# Altium footprint library ALL.PcbLib: 385 footprints (part 4 of 25)
Each footprint in its own frame and in the unit in brackets; x right, y up, seen from the top. Pads: shape width x height; smd on the part's side, far side on the other; paste and mask are expansions set on the pad; w line width, h text height; cw(c..) or ccw(c..) is an arc to the next point about the centre after c.
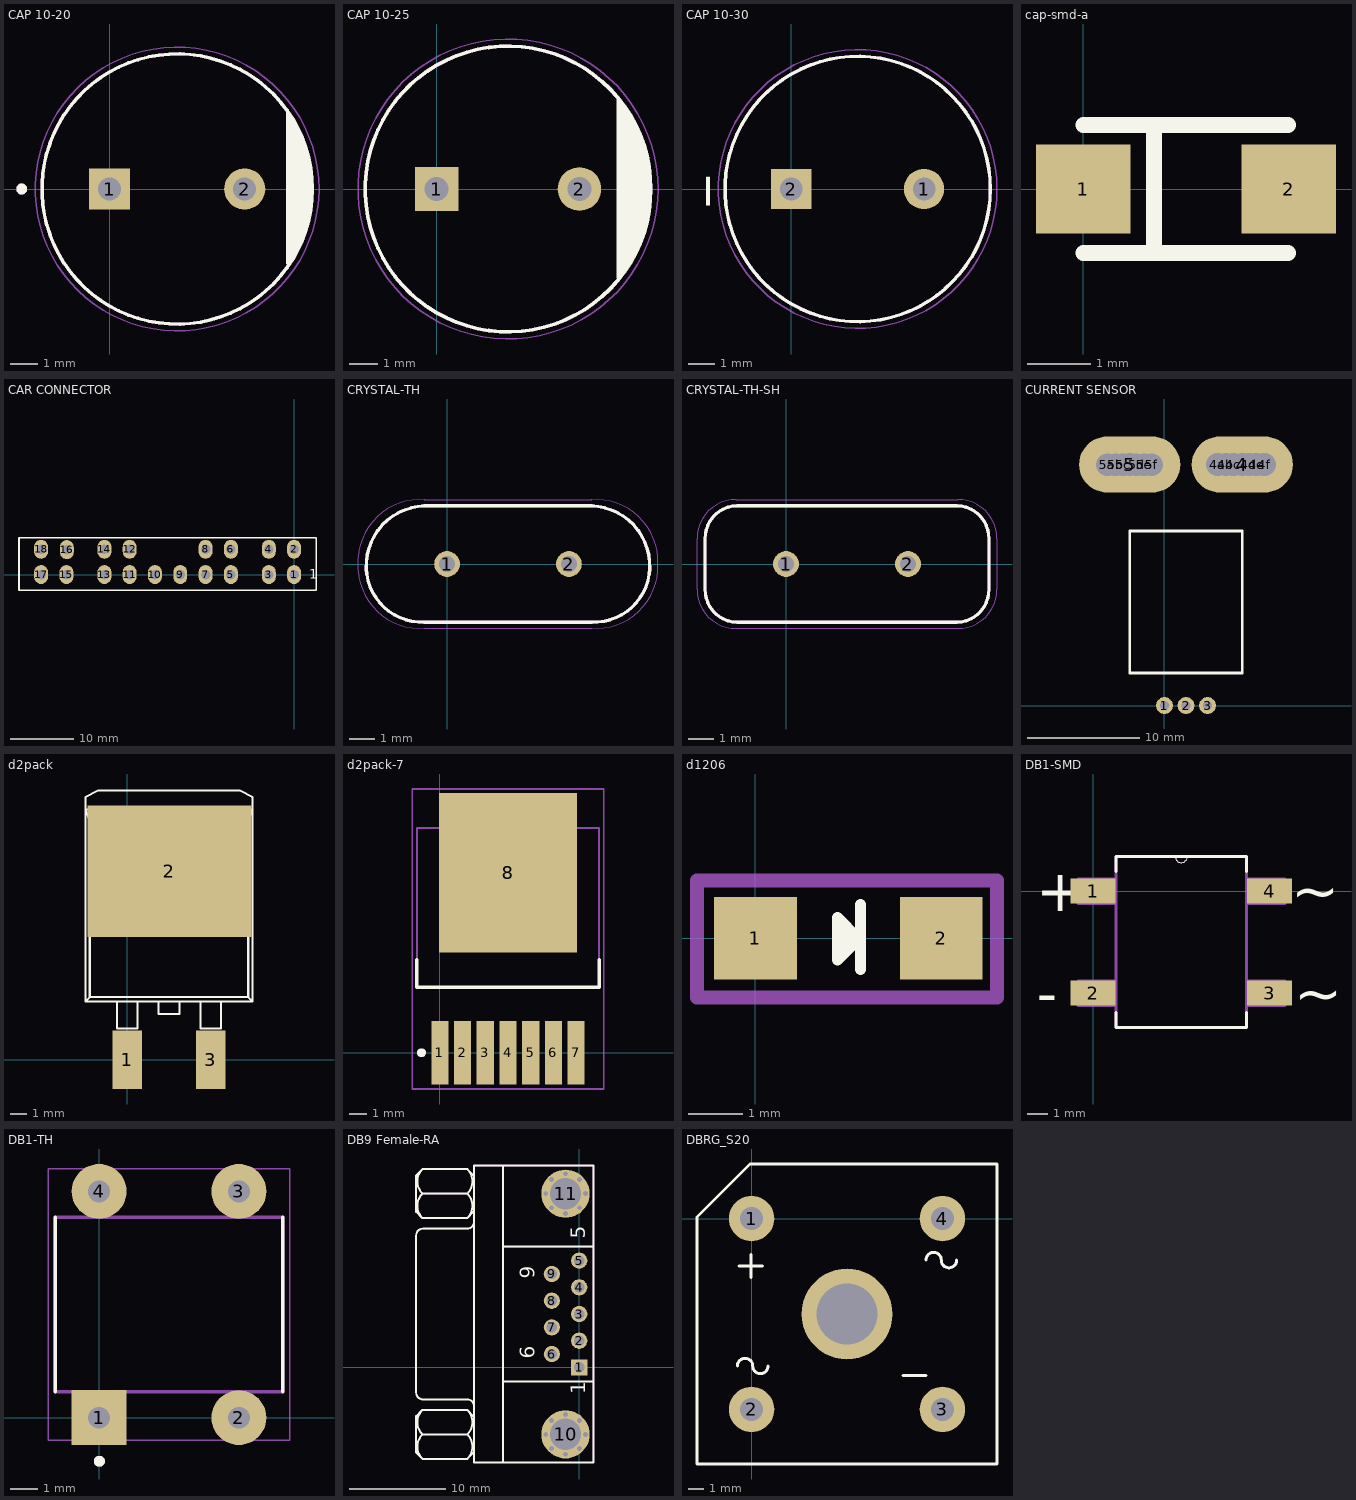
[diagram p3: the footprints below, top view; thin cyan lines are the x and y axes]

## CAP 10-20 [mil]
pads (2):
  rect 60x60 hole 33.46: 1(0,0)
  round 60 hole 33.46: 2(196.85,0)
Top Overlay:
  circle w7.87: c-127.95,0 r3.94
  circle w5: c98.43,0 r196.85
  lines w5.91: 260,-108 260,111 ; 264,-105 264,104 ; 267,-99 267,98 ; 271,-91 271,94 ; 271,-83 274,-80 274,81 ; 278,76 279,75 279,-76 ; 282,63 282,-63 283,-64 ; 286,-53 286,53 ; 289,-39 289,37 ; 292,-21 292,26
Mechanical 13:
  circle w7.87: c-127.95,0 r3.94
  circle w5: c98.43,0 r196.85
Mechanical 15:
  circle w1.97: c98.43,0 r206.69
3D body "step_temp.STEP": height 787.4, standoff -669.29, extent -98.43,-196.85 295.28,196.85

## CAP 10-25 [mil]
pads (2):
  rect 60x60 hole 33.46: 1(0,0)
  round 60 hole 33.46: 2(196.85,0)
Top Overlay:
  circle w5: c98.43,0 r196.85
  lines w5.91: 251,-122 251,123 ; 254,117 255,116 255,-115 ; 259,-110 259,109 ; 261,105 264,102 264,-105 ; 269,-96 269,97 ; 274,-88 274,87 ; 278,-78 278,76 ; 279,69 283,65 283,-65 ; 286,-51 287,-50 287,48 ; 287,35 290,32 290,-33
Mechanical 13:
  circle w5: c98.43,0 r196.85
Mechanical 15:
  circle w1.97: c98.43,0 r206.69
3D body "step_temp.STEP": height 984.25, standoff -669.29, extent -98.43,-196.82 295.28,196.82

## CAP 10-30 [mil]
pads (2):
  round 60 hole 33.46: 1(196.85,0)
  rect 60x60 hole 33.46: 2(0,0)
Top Overlay:
  circle w5: c98.43,0 r196.85
  text "_" at -139.99,-24 h60
Mechanical 13:
  circle w5: c98.43,0 r196.85
Mechanical 15:
  circle w1.97: c98.43,0 r206.69
3D body "step_temp.STEP": height 1181.1, standoff -669.29, extent -98.43,-196.7 295.27,196.68

## cap-smd-a [mm]
pads (2):
  rect 1.5x1.42 smd: 1(0,0) 2(3.26,0)
Top Overlay:
  lines w0.254: 0,-1.016 3.25,-1.016 ; 0,1.016 3.25,1.016 ; 1.122,-1.016 1.122,1.016
3D body "A Case SMT Capacitor.STEP": height 1.77, standoff 0.17, extent -0.007,-0.8 3.167,0.8

## cap-smd-b [mm]

## CAR CONNECTOR [mm]
pads (18):
  oval 2.2x3 hole 1.5: 1(0,0) 2(0,4) 3(-4,0) 4(-4,4) 5(-10,0) 6(-10,4) 7(-14,0) 8(-14,4) 9(-18,0) 10(-22,0) 11(-26,0) 12(-26,4) 13(-30,0) 14(-30,4) 15(-36,0) 16(-35.941,3.937) 17(-40,0) 18(-40,4)
Top Overlay:
  lines w0.254: -43.5,-2.5 3.5,-2.5 3.5,5.842 -43.5,5.842 -43.5,-2.5
  text "1" at 2.413,-0.635 h1.52

## CRYSTAL-TH [mm]
pads (2):
  round 1.03 hole 0.63: 1(0,0) 2(4.88,0)
Top Overlay:
  lines w0.127: -3.235,-0.169 cw(c-0.82,-0.085) -0.904,2.33 ; -3.235,-0.168 ccw(c-0.995,-0.09) -0.917,-2.33 ; -0.91,-2.33 5.79,-2.33 ; -0.91,2.33 5.79,2.33 ; 5.784,2.33 cw(c5.7,-0.085) 8.115,-0.169 ; 5.797,-2.33 ccw(c5.875,-0.09) 8.115,-0.168
Mechanical 13:
  lines w0.127: -3.235,-0.169 cw(c-0.82,-0.085) -0.904,2.33 ; -3.235,-0.168 ccw(c-0.995,-0.09) -0.917,-2.33 ; -0.91,-2.33 5.79,-2.33 ; -0.91,2.33 5.79,2.33 ; 5.784,2.33 cw(c5.7,-0.085) 8.115,-0.169 ; 5.797,-2.33 ccw(c5.875,-0.09) 8.115,-0.168
Mechanical 15:
  lines w0.05: -3.56,-0.25 -3.56,0.25 ; -3.559,-0.264 ccw(c-1.07,-0.09) -0.896,-2.579 ; -3.559,0.264 cw(c-1.07,0.09) -0.896,2.579 ; -0.91,-2.58 5.79,-2.58 ; -0.91,2.58 5.79,2.58 ; 5.776,-2.579 ccw(c5.95,-0.09) 8.439,-0.264 ; 5.776,2.579 cw(c5.95,0.09) 8.439,0.264 ; 8.44,-0.25 8.44,0.25
3D body "ECS-200-S-1 (1).STEP": height 13.46, standoff -12.7, extent -3.185,-2.5 8.165,2.5

## CRYSTAL-TH-SH [mm]
pads (2):
  round 1.03 hole 0.63: 1(0,0) 2(4.88,0)
Top Overlay:
  lines w0.127: -3.235,-1.012 ccw(c-1.94,-1.035) -1.963,-2.33 ; -3.235,-1.01 -3.235,1.01 ; -3.235,1.012 cw(c-1.94,1.035) -1.963,2.33 ; -1.965,-2.33 6.845,-2.33 ; -1.965,2.33 6.845,2.33 ; 6.843,-2.33 ccw(c6.82,-1.035) 8.115,-1.012 ; 6.843,2.33 cw(c6.82,1.035) 8.115,1.012 ; 8.115,-1.01 8.115,1.01
Mechanical 13:
  lines w0.127: -3.235,-1.012 ccw(c-1.94,-1.035) -1.963,-2.33 ; -3.235,-1.01 -3.235,1.01 ; -3.235,1.012 cw(c-1.94,1.035) -1.963,2.33 ; -1.965,-2.33 6.845,-2.33 ; -1.965,2.33 6.845,2.33 ; 6.843,-2.33 ccw(c6.82,-1.035) 8.115,-1.012 ; 6.843,2.33 cw(c6.82,1.035) 8.115,1.012 ; 8.115,-1.01 8.115,1.01
Mechanical 15:
  lines w0.05: -3.56,-1.01 ccw(c-1.99,-1.01) -1.99,-2.58 6.87,-2.58 ccw(c6.87,-1.01) 8.44,-1.01 8.44,1.01 ccw(c6.87,1.01) 6.87,2.58 -1.99,2.58 ccw(c-1.99,1.01) -3.56,1.01 -3.56,-1.01
3D body "ECS-40-S-4 (2).STEP": height 3.5, standoff -12.7, extent -3.235,-2.286 8.115,2.364

## CURRENT SENSOR [mil]
pads (17):
  round 59.06 hole 31.5: 1(0,0) 2(75.2,0) 3(150.39,0)
  oval 353.63x196.63 hole 80: 4(272.05,842.52) 5(-121.65,842.52)
  round 70 hole 80: 4a(185.97,842.52) 4b(214.2,842.52) 4c(240.71,842.52) 4d(295.46,842.52) 4e(322.2,842.52) 4f(350.2,842.52) 5a(-199.8,842) 5b(-170.8,842) 5c(-144.8,842) 5d(-97.8,842) 5e(-70.8,842) 5f(-44.8,842)
Top Overlay:
  lines w10: -121.65,114.17 272.05,114.17 272.05,610.24 -121.65,610.24 -121.65,114.17
3D body: height 159.45, standoff -118.11, extent 65.35,-7.48 85.04,7.48
3D body: height 287.4, standoff 11.81, extent -121.65,114.17 272.05,610.24
3D body: height 177.17, standoff 118.11, extent -202.36,283.46 -40.94,874.02
3D body: height 177.17, standoff 118.11, extent 191.34,283.46 352.76,874.02
3D body: height 118.11, standoff -125.98, extent -202.36,811.02 -40.94,874.02
3D body: height 118.11, standoff -125.98, extent 191.34,811.02 352.76,874.02
3D body: height 159.45, standoff -118.11, extent -9.84,-7.48 9.84,7.48
3D body: height 159.45, standoff -118.11, extent 140.55,-7.48 160.24,7.48
3D body: height 174.41, standoff 159.45, extent 140.55,-7.48 160.24,114.17
3D body: height 174.41, standoff 159.45, extent 65.35,-7.48 85.04,114.17
3D body: height 174.41, standoff 159.45, extent -9.84,-7.48 9.84,114.17

## d2pack [mil]
pads (3):
  rect 70x140 smd: 1(0,0) 3(200,0)
  rect 393.7x314.96 smd: 2(101,452)
Top Overlay:
  lines w5: -25,140 -25,75 25,75 25,140 ; 75,140 75,110 125,110 125,140 ; 175,140 175,75 225,75 225,140 ; -100,140 -100,600 ; -100,140 300,140 ; -100,140 -90,150 ; -100,600 -100,630 -70,645 270,645 300,630 300,600 ; -100,600 300,600 ; -100,600 -90,575 ; -90,150 -90,575 ; -90,150 290,150 ; -90,575 290,575 ; 290,150 290,575 ; 290,150 300,140 ; 290,575 300,600 ; 300,140 300,600
3D body "D2PAK.STEP": height 184.65, standoff -2.52, extent -100,-9.78 300,555.57

## d2pack-7 [mm]
pads (8):
  rect 0.95x3.55 smd: 1(0,0) 2(1.27,0) 3(2.54,0) 4(3.81,0) 5(5.08,0) 6(6.35,0) 7(7.62,0)
  rect 7.7x8.9 smd: 8(3.81,10.05)
Top Overlay:
  circle w0.25: c-1.025,0 r0.125
  lines w0.2: -1.29,5.2 -1.29,3.65 8.91,3.65 8.91,5.2
Mechanical 13:
  lines w0.1: -1.265,3.65 8.885,3.65 8.885,12.54 -1.265,12.54 -1.265,3.65
Mechanical 15:
  lines w0.1: 3.31,6.35 4.31,6.35 ; 3.81,5.85 3.81,6.85 ; -1.54,-2.025 9.16,-2.025 9.16,14.725 -1.54,14.725 -1.54,-2.025
3D body "SW3dPS-TO263-7.STEP": height 4.56, standoff -0.01, extent -1.245,-0.655 8.915,13.711

## d1206 [mil]
pads (2):
  rect 60x60 smd: 1(0,0) 2(135,0)
Top Overlay:
  lines w8: 74.57,-0.77 59.57,-15.77 59.57,15.02 74.57,0.02 ; 76.34,-22.62 76.34,24.62
  lines w12: 61.78,0.02 72.88,0.02
Mechanical 15:
  lines w10: -42.5,-43 -42.5,42 175.5,42 175.5,-43 -42.5,-43
3D body "1206D.step": height 56.54, standoff -0.54, extent -5.4,-28.47 132.4,28.47

## DB1-SMD [mil]
pads (4):
  rect 88x49 smd: 1(0,0) 2(0,-200) 3(346,-200) 4(346,0)
Top Overlay:
  lines w0: 161,68 ccw(c173,68) 185,68
  lines w6: 45,-238 45,-268 301,-268 301,-238 ; 45,38 45,68 161,68 185,68 301,68 301,38
  text "~" at 394.31,-239.21 h82.12
  text "~" at 388.4,-38.89 h82.15
  text "-" at -110.37,-240.18 h82.11
  text "+" at -112,-40 h82.04
Mechanical 13:
  lines w0: 161,68 ccw(c173,68) 185,68
  lines w6: -30,-224 -30,-176 45,-176 45,-224 -30,-224 ; -30,-24 -30,24 45,24 45,-24 -30,-24 ; 45,-268 301,-268 301,68 185,68 161,68 45,68 45,-268 ; 301,-224 301,-176 376,-176 376,-224 301,-224 ; 301,-24 301,24 376,24 376,-24 301,-24
  text "~" at 394.42,-240.29 h82.16
  text "~" at 388.1,-36.97 h82.04
  text "-" at -110.34,-241.17 h82.1
  text "+" at -113.21,-42.96 h82.06
3D body "DF10S--3DModel-STEP-56544.STEP": height 115.35, standoff 0, extent -15.89,-262.99 371.9,62.99

## DB1-TH [mm]
pads (4):
  rect 2x2 hole 0.79: 1(0,0)
  round 2 hole 0.79: 2(5.1,0) 3(5.1,8.25) 4(0,8.25)
Top Overlay:
  circle w0.2: c0.01,-1.59 r0.1
  lines w0.127: -1.6,0.95 -1.6,7.3 ; 6.7,0.95 6.7,7.3
Mechanical 13:
  circle w0.2: c0.01,-1.59 r0.1
  lines w0.127: -1.6,0.95 -1.6,7.3 6.7,7.3 6.7,0.95 -1.6,0.95
Mechanical 15:
  lines w0.05: -1.85,-0.82 -1.85,9.07 6.95,9.07 6.95,-0.82 -1.85,-0.82

## DB9 Female-RA [mm]
pads (27):
  rect 1.69x1.69 hole 1.09: 1(0,0)
  round 1.69 hole 1.09: 2(0,2.77) 3(0,5.54) 4(0,8.31) 5(0,11.08) 6(-2.84,1.385) 7(-2.84,4.155) 8(-2.84,6.925) 9(-2.84,9.695)
  round 0.8 hole 0.5 mask+0.102: 10(-3.48,-6.955) 10(-2.877,-8.412) 10(-2.877,-5.498) 10(-1.42,-9.015) 10(-1.42,-4.895) 10(0.037,-8.412) 10(0.037,-5.498) 10(0.64,-6.955) 11(-3.48,18.035) 11(-2.877,16.578) 11(-2.877,19.492) 11(-1.42,15.975) 11(-1.42,20.095) 11(0.037,16.578) 11(0.037,19.492) 11(0.64,18.035)
  round 5 hole 3.26 mask+0.102: 10(-1.42,-6.955) 11(-1.42,18.035)
Top Overlay:
  lines w0.2: -16.285,-9.498 -16.92,-8.863 -16.92,-5.053 -16.285,-4.418 ; -16.285,15.502 -16.92,16.137 -16.92,19.947 -16.285,20.582 ; -16.27,-9.498 -11.619,-9.498 -10.984,-8.863 ; -16.27,-6.958 -11.619,-6.958 ; -16.27,-4.418 -11.619,-4.418 -10.984,-5.053 ; -16.27,15.502 -11.619,15.502 -10.984,16.137 ; -16.27,18.042 -11.619,18.042 ; -16.27,20.582 -11.619,20.582 -10.984,19.947 ; -16.225,-3.32 cw(c-16.225,-2.625) -16.92,-2.625 -16.92,13.705 cw(c-16.225,13.705) -16.225,14.4 ; -16.22,-3.325 -11.62,-3.325 cw(c-11.62,-4.02) -10.925,-4.02 ; -16.22,14.405 -11.62,14.405 ccw(c-11.62,15.1) -10.925,15.1 ; -15.218,-4.418 -15.006,-4.418 ; -15.218,20.582 -15.006,20.582 ; -7.92,-9.86 -7.92,20.94 ; -7.92,-1.46 1.48,-1.46 ; -7.92,12.54 1.48,12.54 ; -10.92,-9.86 1.48,-9.86 1.48,20.94 -10.92,20.94 -10.92,-9.86
  lines w0.203: -16.27,-9.498 cw(c-14.998,-8.226) -16.27,-6.953 ; -16.27,-6.962 cw(c-14.998,-5.69) -16.27,-4.418 ; -16.27,15.502 cw(c-14.998,16.774) -16.27,18.047 ; -16.27,18.038 cw(c-14.998,19.31) -16.27,20.582 ; -11.617,-9.5 ccw(c-12.889,-8.228) -11.617,-6.956 ; -11.617,-6.96 ccw(c-12.889,-5.688) -11.617,-4.416 ; -11.617,15.5 ccw(c-12.889,16.772) -11.617,18.044 ; -11.617,18.04 ccw(c-12.889,19.312) -11.617,20.584
  text "1" at 0.64,-2.794 h1.5
  text "5" at 0.64,13.335 h1.5
  text "9" at -4.6,9.2 h1.5
  text "6" at -4.6,0.9 h1.5
Mechanical 1:
  lines w0.1: -16.92,-2.625 ccw(c-16.225,-2.625) -16.225,-3.32 ; -16.92,13.705 cw(c-16.225,13.705) -16.225,14.4 ; -11.62,-3.325 cw(c-11.62,-4.02) -10.925,-4.02 ; -11.62,14.405 ccw(c-11.62,15.1) -10.925,15.1
Mechanical 13:
  lines w0.1: -16.92,-2.625 -16.92,13.705 ; -16.285,-9.498 -16.92,-8.863 -16.92,-5.053 -16.285,-4.418 ; -16.285,15.502 -16.92,16.137 -16.92,19.947 -16.285,20.582 ; -16.27,-6.962 cw(c-14.998,-5.69) -16.27,-4.418 -11.619,-4.418 -10.984,-5.053 ; -16.27,-6.958 -11.619,-6.958 ; -16.27,-6.953 ccw(c-14.998,-8.226) -16.27,-9.498 -11.619,-9.498 -10.984,-8.863 ; -16.27,18.038 cw(c-14.998,19.31) -16.27,20.582 -11.619,20.582 -10.984,19.947 ; -16.27,18.042 -11.619,18.042 ; -16.27,18.047 ccw(c-14.998,16.774) -16.27,15.502 -11.619,15.502 -10.984,16.137 ; -16.22,-3.325 -11.62,-3.325 ; -16.22,14.405 -11.62,14.405 ; -15.218,-4.418 -15.006,-4.418 ; -15.218,20.582 -15.006,20.582 ; -11.617,-9.5 ccw(c-12.889,-8.228) -11.617,-6.956 ; -11.617,-6.96 ccw(c-12.889,-5.688) -11.617,-4.416 ; -11.617,15.5 ccw(c-12.889,16.772) -11.617,18.044 ; -11.617,18.04 ccw(c-12.889,19.312) -11.617,20.584 ; -7.92,-9.86 -7.92,20.94 ; -7.92,-1.46 1.48,-1.46 ; -7.92,12.54 1.48,12.54 ; -10.92,-9.86 1.48,-9.86 1.48,20.94 -10.92,20.94 -10.92,-9.86
3D body "9-PIN_DSUB-1.STEP": height 12.71, standoff -3.01, extent -17.041,-9.865 2.034,20.945

## DBRG_S20 [mm]
pads (5):
  round 3 hole 1.5: 1(0,0) 2(0,-12.6) 3(12.6,-12.6) 4(12.6,0)
  round 6 hole 4: ""(6.3,-6.3)
Top Overlay:
  lines w0.2: -0.939,-9.729 cw(c-0.431,-9.729) 0.077,-9.729 ccw(c0.585,-9.729) 1.093,-9.729 ; -0.812,-3.125 0.712,-3.125 ; -0.05,-3.887 -0.05,-2.363 ; 9.983,-10.364 11.507,-10.364 ; 11.507,-2.744 cw(c12.015,-2.744) 12.523,-2.744 ccw(c13.031,-2.744) 13.539,-2.744 ; -3.6,-16.2 16.2,-16.2 16.2,3.6 -0.1,3.6 -3.6,0.1 -3.6,-16.2
3D body "User Library-BR-8.step": height 7.5, standoff -3.5, extent -3.5,-16.1 16.1,3.5